# Altium footprint library smdComponent.PcbLib: 182 footprints (part 6 of 12)
Each footprint in its own frame and in the unit in brackets; x right, y up, seen from the top. Pads: shape width x height; smd on the part's side, far side on the other; paste and mask are expansions set on the pad; w line width, h text height; cw(c..) or ccw(c..) is an arc to the next point about the centre after c.
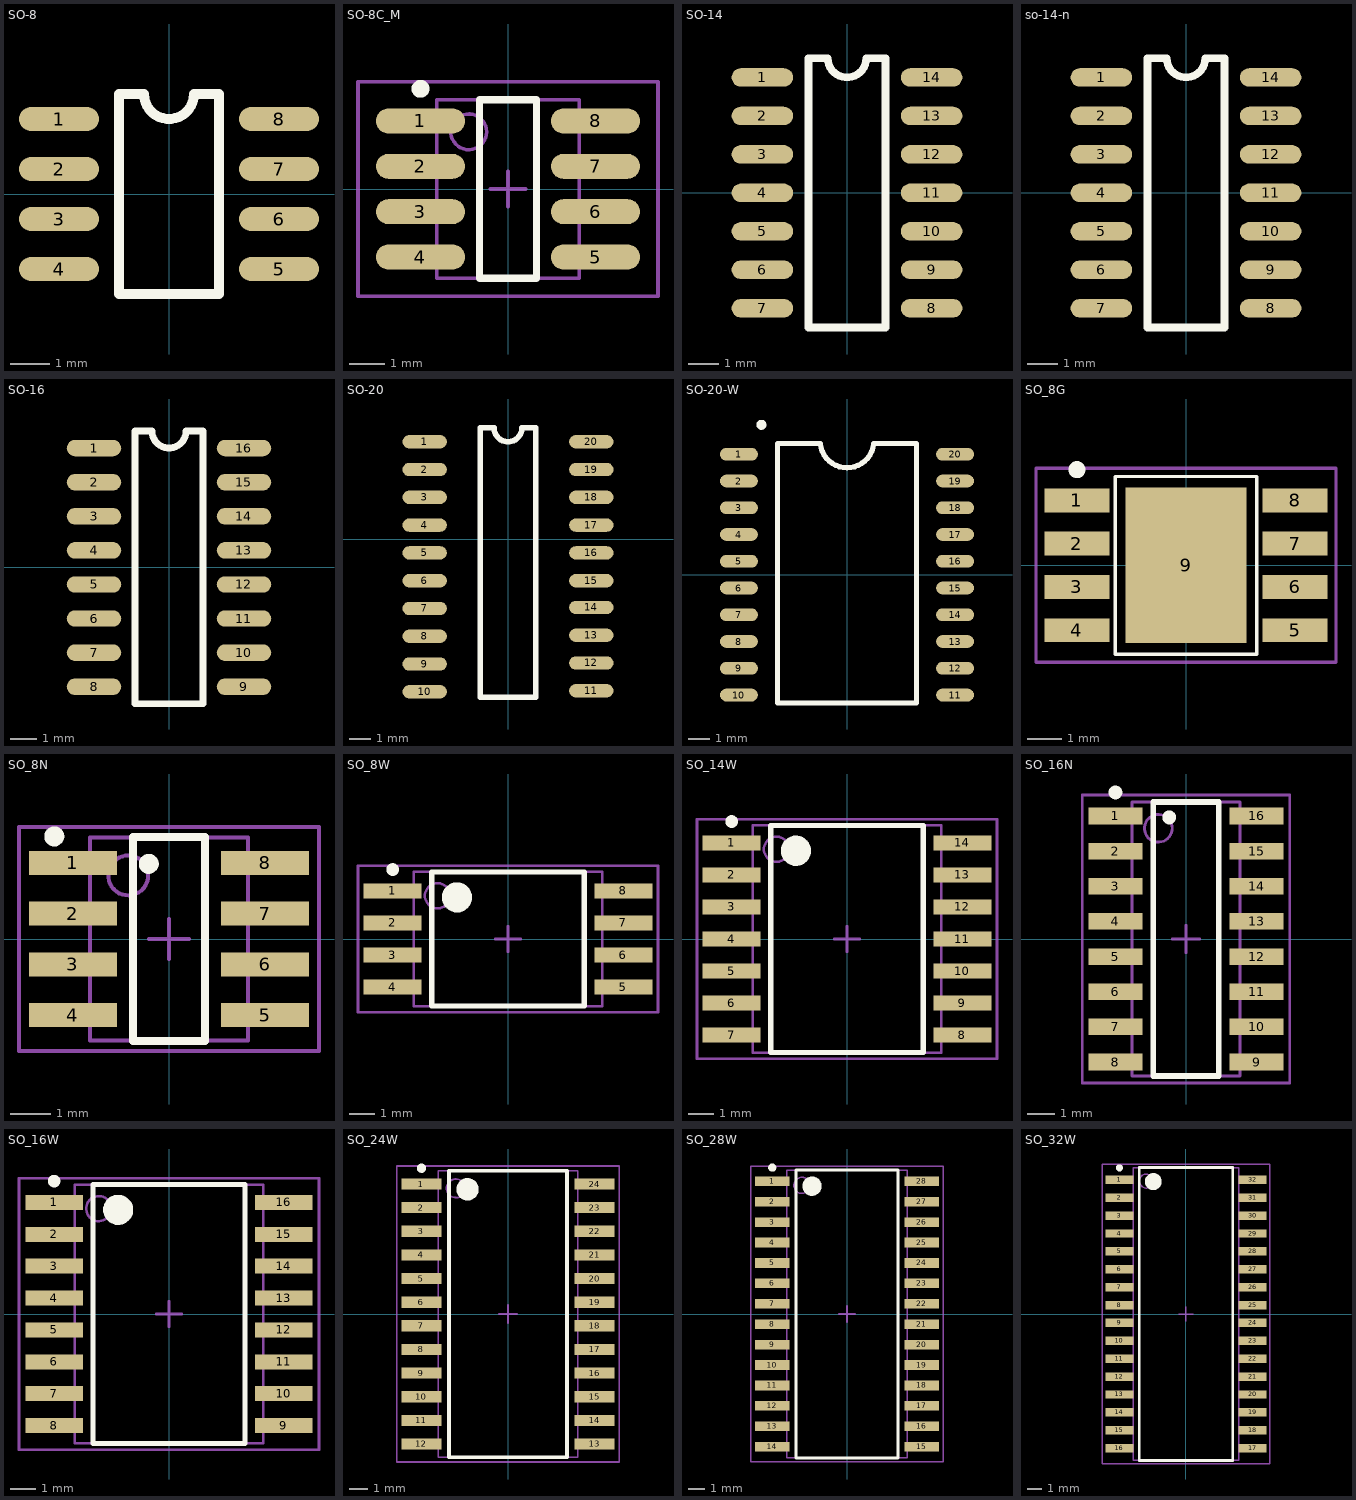
[diagram p5: the footprints below, top view; thin cyan lines are the x and y axes]

## SO-8 [mil]
pads (8):
  oval 80x24 smd: 1(-110,75) 2(-110,25) 3(-110,-25) 4(-110,-75) 5(110,-75) 6(110,-25) 7(110,25) 8(110,75)
Top Overlay:
  lines w10: -50,-100 -50,100 -25,100 ccw(c0,100) 25,100 50,100 50,-100 -50,-100
3D body "SW3DPS-SO-8 (PIC12FXXX)-DEFAULT.STEP": height 63.6, standoff 0.6, extent -122.42,-98.11 113.41,94.8

## SO-8C_M [mm] "8-Pin Small Outline Integrated Circuit 1.27 mm Pitch, IPC Low Density"
height 1.75
pads (8):
  oval 2.5x0.7 smd: 1(-2.45,1.905) 2(-2.45,0.635) 3(-2.45,-0.635) 4(-2.45,-1.905) 5(2.45,-1.905) 6(2.45,-0.635) 7(2.45,0.635) 8(2.45,1.905)
Top Overlay:
  circle w0.25: c-2.45,2.805 r0.125
  lines w0.2: -0.8,-2.5 0.8,-2.5 0.8,2.5 -0.8,2.5 -0.8,-2.5
Mechanical 13:
  circle w0.1: c-1.1,1.6 r0.5
  lines w0.1: -2,-2.5 2,-2.5 2,2.5 -2,2.5 -2,-2.5
Mechanical 15:
  lines w0.1: -0.5,0 0.5,0 ; 0,-0.5 0,0.5 ; -4.2,-3 4.2,-3 4.2,3 -4.2,3 -4.2,-3
3D body "SW3DPS-SO-8 (PIC12FXXX)-DEFAULT.STEP": height 1.62, standoff 0.02, extent -3.057,-2.492 2.933,2.408

## SO-14 [mil]
pads (14):
  oval 80x24 smd: 1(-110,150) 2(-110,100) 3(-110,50) 4(-110,0) 5(-110,-50) 6(-110,-100) 7(-110,-150) 8(110,-150) 9(110,-100) 10(110,-50) 11(110,0) 12(110,50) 13(110,100) 14(110,150)
Top Overlay:
  lines w10: -50,-175 -50,175 -25,175 ccw(c0,175) 25,175 50,175 50,-175 -50,-175
3D body "SO-14.step": height 69, standoff 0, extent -120,-170 120,170

## so-14-n [mil]
pads (14):
  oval 80x24 smd: 1(-110,150) 2(-110,100) 3(-110,50) 4(-110,0) 5(-110,-50) 6(-110,-100) 7(-110,-150) 8(110,-150) 9(110,-100) 10(110,-50) 11(110,0) 12(110,50) 13(110,100) 14(110,150)
Top Overlay:
  lines w10: -50,-175 50,-175 50,175 25,175 cw(c0,175) -25,175 -50,175 -50,-175

## SO-16 [mil]
pads (16):
  oval 80x24 smd: 1(-110,175) 2(-110,125) 3(-110,75) 4(-110,25) 5(-110,-25) 6(-110,-75) 7(-110,-125) 8(-110,-175) 9(110,-175) 10(110,-125) 11(110,-75) 12(110,-25) 13(110,25) 14(110,75) 15(110,125) 16(110,175)
Top Overlay:
  lines w10: -50,-200 -50,200 -25,200 ccw(c0,200) 25,200 50,200 50,-200 -50,-200
3D body "SW3DPS-SO-16-DEFAULT.STEP": height 53.6, standoff -3.4, extent -118.26,-195.27 114.24,197.73

## SO-20 [mil]
pads (20):
  oval 80x24 smd: 1(-150,175) 2(-150,125) 3(-150,75) 4(-150,25) 5(-150,-25) 6(-150,-75) 7(-150,-125) 8(-150,-175) 9(-150,-225) 10(-150,-275) 11(150,-273.2) 12(150,-223.2) 13(150,-173.2) 14(150,-123.2) 15(150,-75) 16(150,-25) 17(150,25) 18(150,75) 19(150,125) 20(150,175)
Top Overlay:
  lines w10: -50,-284.69 50,-284.69 50,200 25,200 cw(c0,200) -25,200 -50,200 -50,-284.69

## SO-20-W [mil] "wide for 74hc541"
pads (20):
  oval 70.87x24 smd: 1(-202,225) 2(-202,175) 3(-202,125) 4(-202,75) 5(-202,25) 6(-202,-25) 7(-202,-75) 8(-202,-125) 9(-202,-175) 10(-202,-225) 11(202,-225) 12(202,-175) 13(202,-125) 14(202,-75) 15(202,-25) 16(202,25) 17(202,75) 18(202,125) 19(202,175) 20(202,225)
Top Overlay:
  circle w10: c-160,280 r4.24
  lines w10: -130,-240 -130,245 -50,245 ccw(c0,250) 50,245 130,245 130,-240 -130,-240
3D body "SO-20W.STEP": height -17, standoff -114.64, extent -202.95,-252.36 202.96,252.36

## SO_8G [mm] "SOIC, 8-Leads, Body 5.2x4.1mm (max), Pitch 1.27mm, IPC Medium Density"
height 2.413
pads (9):
  rect 1.9x0.7 smd: 1(-3.2,1.905) 2(-3.2,0.635) 3(-3.2,-0.635) 4(-3.2,-1.905) 5(3.2,-1.905) 6(3.2,-0.635) 7(3.2,0.635) 8(3.2,1.905)
  rect 3.556x4.572 smd: 9(0,0)
Top Overlay:
  circle w0.25: c-3.2,2.805 r0.125
  lines w0.1: -2.07,-2.605 -2.07,2.605 2.07,2.605 2.07,-2.605 -2.07,-2.605
Mechanical 13:
  circle w0.1: c-1.12,1.655 r0.5
Mechanical 15:
  lines w0.1: -0.5,0 0.5,0 ; 0,-0.5 0,0.5 ; -4.4,-2.85 4.4,-2.85 4.4,2.85 -4.4,2.85 -4.4,-2.85
3D body: height 2.41, standoff 0.18, extent -2.07,-2.605 2.07,2.605

## SO_8N [mm] "SOIC, 8-Leads, Body 5.1x3.9mm (max), Pitch 1.27mm, IPC Medium Density"
height 3.2
pads (8):
  rect 2.2x0.6 smd: 1(-2.4,1.905) 2(-2.4,0.635) 3(-2.4,-0.635) 4(-2.4,-1.905) 5(2.4,-1.905) 6(2.4,-0.635) 7(2.4,0.635) 8(2.4,1.905)
Top Overlay:
  circle w0.25: c-0.506,1.88 r0.125
  circle w0.25: c-2.868,2.565 r0.125
  lines w0.2: -0.9,-2.55 0.9,-2.55 0.9,2.55 -0.9,2.55 -0.9,-2.55
Mechanical 13:
  circle w0.1: c-1.02,1.59 r0.5
  lines w0.1: -1.97,-2.54 1.97,-2.54 1.97,2.54 -1.97,2.54 -1.97,-2.54
Mechanical 15:
  lines w0.1: -0.5,0 0.5,0 ; 0,-0.5 0,0.5 ; -3.75,-2.8 3.75,-2.8 3.75,2.8 -3.75,2.8 -3.75,-2.8
3D body "SW3dPS-Maxim_SOIC8.STEP": height 1.85, standoff 0, extent -3.048,-2.5 3.152,2.5

## SO_8W [mm] "SOIC, 8-Leads, Body 5.3x7.5mm (max), Pitch 1.27mm, IPC Medium Density"
height 2.54
pads (8):
  rect 2.3x0.6 smd: 1(-4.575,1.905) 2(-4.575,0.635) 3(-4.575,-0.635) 4(-4.575,-1.905) 5(4.575,-1.905) 6(4.575,-0.635) 7(4.575,0.635) 8(4.575,1.905)
Top Overlay:
  circle w0.25: c-4.575,2.755 r0.125
  circle w0.6: c-2.025,1.65 r0.3
  lines w0.2: -3.025,-2.65 -3.025,2.65 3.025,2.65 3.025,-2.65 -3.025,-2.65
Mechanical 13:
  circle w0.1: c-2.795,1.715 r0.5
  lines w0.1: -3.745,-2.665 -3.745,2.665 3.745,2.665 3.745,-2.665 -3.745,-2.665
Mechanical 15:
  lines w0.1: -0.5,0 0.5,0 ; 0,-0.5 0,0.5 ; -5.95,-2.9 -5.95,2.9 5.95,2.9 5.95,-2.9 -5.95,-2.9
3D body: height 2.54, standoff 0.2, extent -3.745,-2.665 3.745,2.665

## SO_14W [mm] "SOIC, 14-Leads, Body 9.0x7.5mm (max), Pitch 1.27mm, IPC Medium Density"
height 2.54
pads (14):
  rect 2.3x0.6 smd: 1(-4.575,3.81) 2(-4.575,2.54) 3(-4.575,1.27) 4(-4.575,0) 5(-4.575,-1.27) 6(-4.575,-2.54) 7(-4.575,-3.81) 8(4.575,-3.81) 9(4.575,-2.54) 10(4.575,-1.27) 11(4.575,0) 12(4.575,1.27) 13(4.575,2.54) 14(4.575,3.81)
Top Overlay:
  circle w0.25: c-4.575,4.66 r0.125
  circle w0.6: c-2.025,3.5 r0.3
  lines w0.2: -3.025,-4.5 -3.025,4.5 3.025,4.5 3.025,-4.5 -3.025,-4.5
Mechanical 13:
  circle w0.1: c-2.795,3.56 r0.5
  lines w0.1: -3.745,-4.51 -3.745,4.51 3.745,4.51 3.745,-4.51 -3.745,-4.51
Mechanical 15:
  lines w0.1: -0.5,0 0.5,0 ; 0,-0.5 0,0.5 ; -5.95,-4.75 -5.95,4.75 5.95,4.75 5.95,-4.75 -5.95,-4.75
3D body: height 2.54, standoff 0.2, extent -3.745,-4.51 3.745,4.51

## SO_16N [mm] "SOIC, 16-Leads, Body 9.9x3.9mm (max), Pitch 1.27mm, IPC Medium Density"
height 1.75
pads (16):
  rect 1.95x0.6 smd: 1(-2.55,4.445) 2(-2.55,3.175) 3(-2.55,1.905) 4(-2.55,0.635) 5(-2.55,-0.635) 6(-2.55,-1.905) 7(-2.55,-3.175) 8(-2.55,-4.445) 9(2.55,-4.445) 10(2.55,-3.175) 11(2.55,-1.905) 12(2.55,-0.635) 13(2.55,0.635) 14(2.55,1.905) 15(2.55,3.175) 16(2.55,4.445)
Top Overlay:
  circle w0.25: c-2.55,5.295 r0.125
  circle w0.25: c-0.608,4.394 r0.125
  lines w0.2: -1.175,-4.95 -1.175,4.95 1.175,4.95 1.175,-4.95 -1.175,-4.95
Mechanical 13:
  circle w0.1: c-1,4 r0.5
  lines w0.1: -1.95,-4.95 -1.95,4.95 1.95,4.95 1.95,-4.95 -1.95,-4.95
Mechanical 15:
  lines w0.1: -0.5,0 0.5,0 ; 0,-0.5 0,0.5 ; -3.75,-5.2 -3.75,5.2 3.75,5.2 3.75,-5.2 -3.75,-5.2
3D body: height 1.75, standoff 0.15, extent -1.95,-4.95 1.95,4.95

## SO_16W [mm] "SOIC, 16-Leads, Body 10.3x7.5mm (max), Pitch 1.27mm, IPC Medium Density"
height 2.4
pads (16):
  rect 2.3x0.6 smd: 1(-4.575,4.445) 2(-4.575,3.175) 3(-4.575,1.905) 4(-4.575,0.635) 5(-4.575,-0.635) 6(-4.575,-1.905) 7(-4.575,-3.175) 8(-4.575,-4.445) 9(4.575,-4.445) 10(4.575,-3.175) 11(4.575,-1.905) 12(4.575,-0.635) 13(4.575,0.635) 14(4.575,1.905) 15(4.575,3.175) 16(4.575,4.445)
Top Overlay:
  circle w0.25: c-4.575,5.295 r0.125
  circle w0.6: c-2.025,4.15 r0.3
  lines w0.2: -3.025,-5.15 -3.025,5.15 3.025,5.15 3.025,-5.15 -3.025,-5.15
Mechanical 13:
  circle w0.1: c-2.8,4.2 r0.5
  lines w0.1: -3.75,-5.15 -3.75,5.15 3.75,5.15 3.75,-5.15 -3.75,-5.15
Mechanical 15:
  lines w0.1: -0.5,0 0.5,0 ; 0,-0.5 0,0.5 ; -5.975,-5.4 -5.975,5.4 5.975,5.4 5.975,-5.4 -5.975,-5.4
3D body "SW3DPS-SOL-16-DEFAULT.STEP": height 1.75, standoff 0, extent -4.648,-4.851 4.652,5.149

## SO_24W [mm] "SOIC, 24-Leads, Body 15.4x7.5mm (max), Pitch 1.27mm, IPC Medium Density"
height 2.4
pads (24):
  rect 2.15x0.6 smd: 1(-4.65,6.985) 2(-4.65,5.715) 3(-4.65,4.445) 4(-4.65,3.175) 5(-4.65,1.905) 6(-4.65,0.635) 7(-4.65,-0.635) 8(-4.65,-1.905) 9(-4.65,-3.175) 10(-4.65,-4.445) 11(-4.65,-5.715) 12(-4.65,-6.985) 13(4.65,-6.985) 14(4.65,-5.715) 15(4.65,-4.445) 16(4.65,-3.175) 17(4.65,-1.905) 18(4.65,-0.635) 19(4.65,0.635) 20(4.65,1.905) 21(4.65,3.175) 22(4.65,4.445) 23(4.65,5.715) 24(4.65,6.985)
Top Overlay:
  circle w0.6: c-2.175,6.7 r0.3
  circle w0.25: c-4.65,7.835 r0.125
  lines w0.2: -3.175,-7.7 3.175,-7.7 3.175,7.7 -3.175,7.7 -3.175,-7.7
Mechanical 13:
  circle w0.1: c-2.8,6.75 r0.5
  lines w0.1: -3.75,-7.7 3.75,-7.7 3.75,7.7 -3.75,7.7 -3.75,-7.7
Mechanical 15:
  lines w0.1: -0.5,0 0.5,0 ; 0,-0.5 0,0.5 ; -5.975,-7.95 5.975,-7.95 5.975,7.95 -5.975,7.95 -5.975,-7.95
3D body: height 2.4, standoff 0.2, extent -3.75,-7.7 3.75,7.7

## SO_28W [mm] "SOIC, 28-Leads, Body 17.9x7.5mm (max), Pitch 1.27mm, IPC Medium Density"
height 1.75
pads (28):
  rect 2.15x0.6 smd: 1(-4.65,8.255) 2(-4.65,6.985) 3(-4.65,5.715) 4(-4.65,4.445) 5(-4.65,3.175) 6(-4.65,1.905) 7(-4.65,0.635) 8(-4.65,-0.635) 9(-4.65,-1.905) 10(-4.65,-3.175) 11(-4.65,-4.445) 12(-4.65,-5.715) 13(-4.65,-6.985) 14(-4.65,-8.255) 15(4.65,-8.255) 16(4.65,-6.985) 17(4.65,-5.715) 18(4.65,-4.445) 19(4.65,-3.175) 20(4.65,-1.905) 21(4.65,-0.635) 22(4.65,0.635) 23(4.65,1.905) 24(4.65,3.175) 25(4.65,4.445) 26(4.65,5.715) 27(4.65,6.985) 28(4.65,8.255)
Top Overlay:
  circle w0.25: c-4.65,9.105 r0.125
  circle w0.6: c-2.175,7.95 r0.3
  lines w0.2: -3.175,-8.95 -3.175,8.95 3.175,8.95 3.175,-8.95 -3.175,-8.95
Mechanical 13:
  circle w0.1: c-2.8,8 r0.5
  lines w0.1: -3.75,-8.95 -3.75,8.95 3.75,8.95 3.75,-8.95 -3.75,-8.95
Mechanical 15:
  lines w0.1: -0.5,0 0.5,0 ; 0,-0.5 0,0.5 ; -5.975,-9.2 -5.975,9.2 5.975,9.2 5.975,-9.2 -5.975,-9.2
3D body "SW3DPS-SOL-28-DEFAULT.STEP": height 1.75, standoff 0, extent -4.623,-8.814 4.677,8.946

## SO_32W [mm] "SOIC, 32-Leads, Body 20.8x7.5mm (max), Pitch 1.27mm, IPC Medium Density"
height 2.413
pads (32):
  rect 2x0.6 smd: 1(-4.725,9.525) 2(-4.725,8.255) 3(-4.725,6.985) 4(-4.725,5.715) 5(-4.725,4.445) 6(-4.725,3.175) 7(-4.725,1.905) 8(-4.725,0.635) 9(-4.725,-0.635) 10(-4.725,-1.905) 11(-4.725,-3.175) 12(-4.725,-4.445) 13(-4.725,-5.715) 14(-4.725,-6.985) 15(-4.725,-8.255) 16(-4.725,-9.525) 17(4.725,-9.525) 18(4.725,-8.255) 19(4.725,-6.985) 20(4.725,-5.715) 21(4.725,-4.445) 22(4.725,-3.175) 23(4.725,-1.905) 24(4.725,-0.635) 25(4.725,0.635) 26(4.725,1.905) 27(4.725,3.175) 28(4.725,4.445) 29(4.725,5.715) 30(4.725,6.985) 31(4.725,8.255) 32(4.725,9.525)
Top Overlay:
  circle w0.25: c-4.725,10.375 r0.125
  circle w0.6: c-2.325,9.4 r0.3
  lines w0.2: -3.325,-10.4 -3.325,10.4 3.325,10.4 3.325,-10.4 -3.325,-10.4
Mechanical 13:
  circle w0.1: c-2.81,9.44 r0.5
  lines w0.1: -3.76,-10.39 -3.76,10.39 3.76,10.39 3.76,-10.39 -3.76,-10.39
Mechanical 15:
  lines w0.1: -0.5,0 0.5,0 ; 0,-0.5 0,0.5 ; -5.95,-10.65 -5.95,10.65 5.95,10.65 5.95,-10.65 -5.95,-10.65
3D body: height 2.41, standoff 0.18, extent -3.76,-10.39 3.76,10.39